# Altium footprint library UWRT_Footprint_Library_2020.PcbLib: 376 footprints (part 10 of 24)
Each footprint in its own frame and in the unit in brackets; x right, y up, seen from the top. Pads: shape width x height; smd on the part's side, far side on the other; paste and mask are expansions set on the pad; w line width, h text height; cw(c..) or ccw(c..) is an arc to the next point about the centre after c.
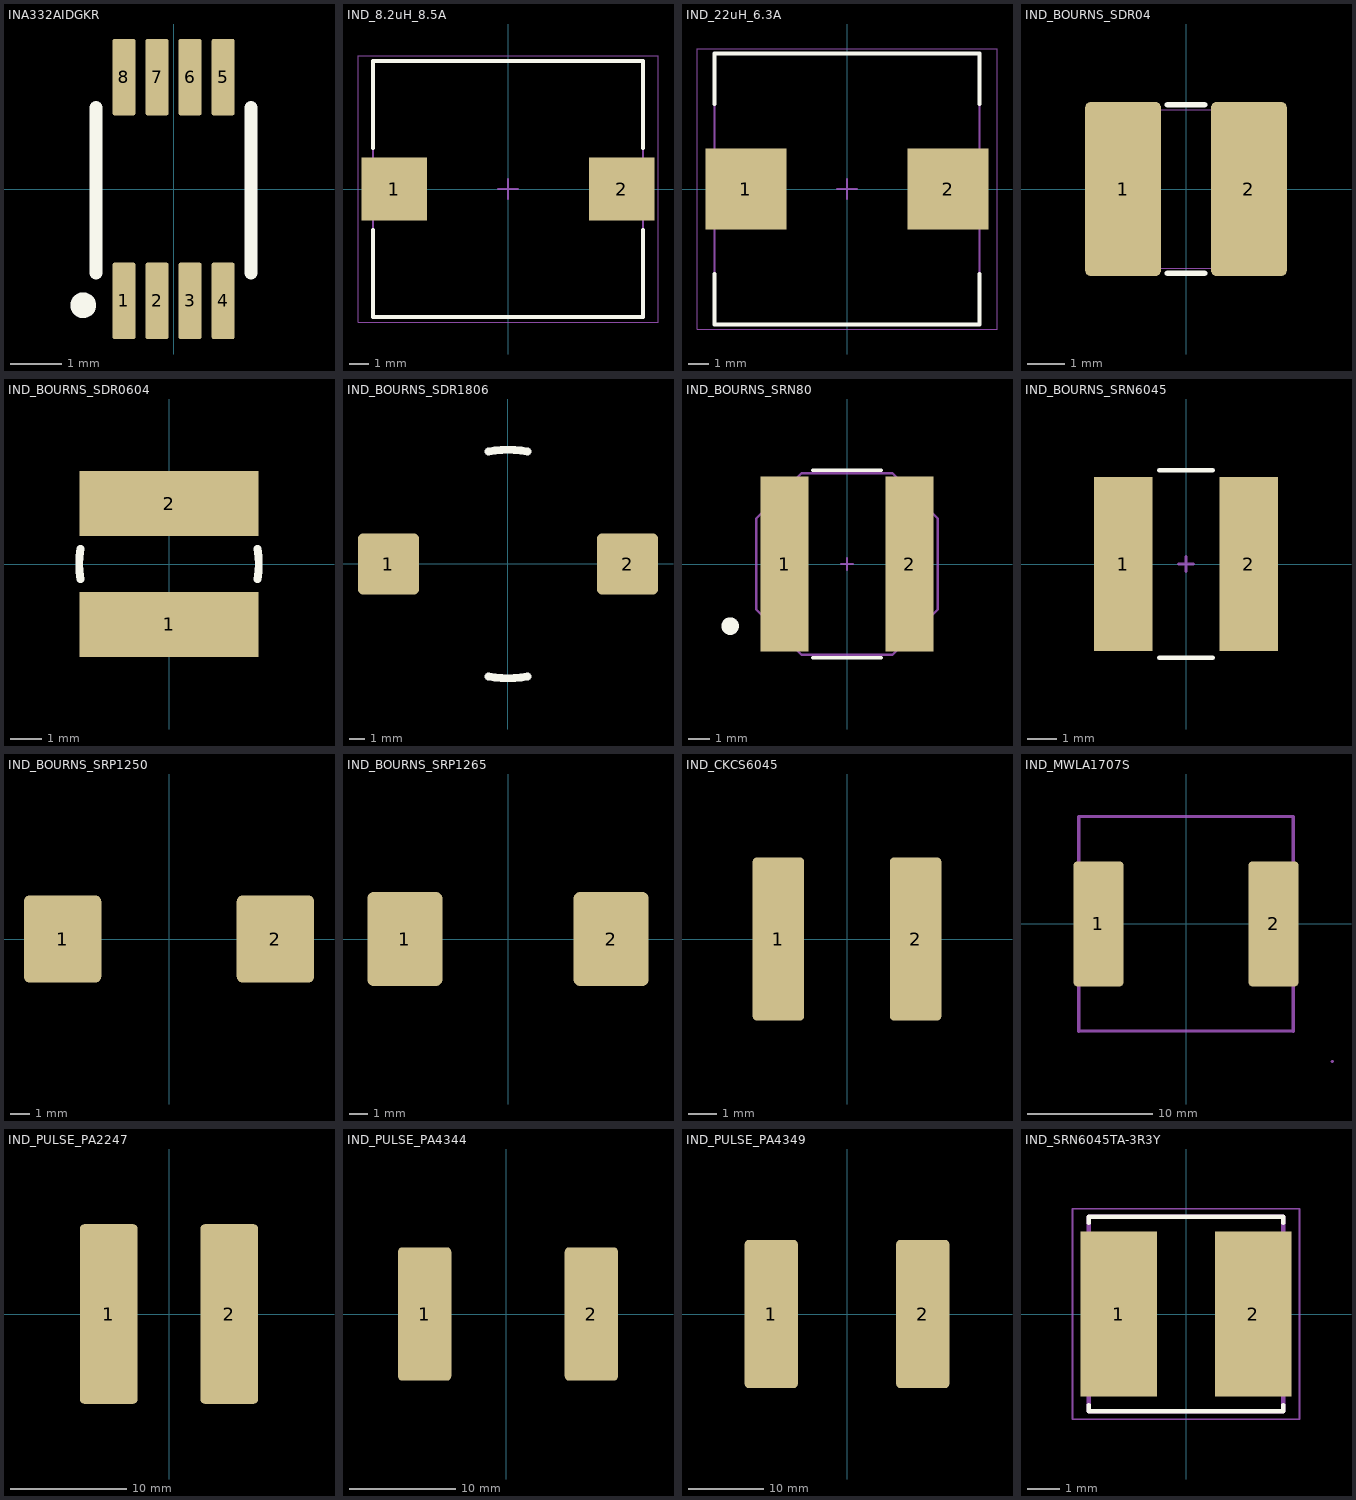
[diagram p9: the footprints below, top view; thin cyan lines are the x and y axes]

## INA332AIDGKR [mm] "Instrumentation amplifier, 8-VSSOP"
pads (8):
  rrect15% 0.45x1.5 smd mask+0.05: 1(-0.975,-2.2) 2(-0.325,-2.2) 3(0.325,-2.2) 4(0.975,-2.2) 5(0.975,2.2) 6(0.325,2.2) 7(-0.325,2.2) 8(-0.975,2.2)
Top Overlay:
  circle w0.254: c-1.778,-2.286 r0.127
  lines w0.254: -1.524,-1.651 -1.524,1.6 ; 1.524,-1.651 1.524,1.6
3D body "User Library-SOP50P310X110-8N[VSSOP_DGK_MO-187AA].STEP": height 1.15, standoff 0, extent -1.55,-2.522 1.55,2.522

## IND_8.2uH_8.5A [mm]
height 3.5
pads (2):
  rect 3.3x3.175 smd: 1(-5.715,0) 2(5.715,0)
Top Overlay:
  lines w0.2: -6.8,-2.075 -6.8,-6.45 6.8,-6.45 6.8,-2.075 ; -6.8,2.075 -6.8,6.45 6.8,6.45 6.8,2.075
Mechanical 13:
  lines w0.1: -6.79,-6.45 6.79,-6.45 6.79,6.45 -6.79,6.45 -6.79,-6.45
Mechanical 15:
  lines w0.05: -7.55,-6.7 7.55,-6.7 7.55,6.7 -7.55,6.7 -7.55,-6.7
  lines w0.1: -0.5,0 0.5,0 ; 0,-0.5 0,0.5
3D body "IND_8.2uH_8.5A.step": height 3.5, standoff 0, extent -7.01,-6.45 7.01,6.45

## IND_22uH_6.3A [mm] "Precision Wire Wound Inductor, 2-Leads, Body 13.10x13.40mm, IPC Medium Density"
height 3.7
pads (2):
  rect 4x4 smd: 1(-5,0) 2(5,0)
Top Overlay:
  lines w0.2: -6.55,-4.2 -6.55,-6.7 6.55,-6.7 6.55,-4.2 ; -6.55,4.2 -6.55,6.7 6.55,6.7 6.55,4.2
Mechanical 13:
  lines w0.1: -6.55,-6.7 -6.55,6.7 6.55,6.7 6.55,-6.7 -6.55,-6.7
Mechanical 15:
  lines w0.05: -7.425,-6.95 -7.425,6.95 7.425,6.95 7.425,-6.95 -7.425,-6.95
  lines w0.1: -0.5,0 0.5,0 ; 0,-0.5 0,0.5
3D body: height 3.7, standoff 0, extent -6.55,-6.7 6.55,6.7

## IND_BOURNS_SDR04 [mm] "SDR0403 Series - SMD Power Inductors"
height 3.5
pads (2):
  rrect15% 2.05x4.7 smd paste+0 mask+0.102: 1(-1.7,0) 2(1.7,0)
Top Overlay:
  lines w0.152: -0.5,-2.273 0.5,-2.273 ; -0.5,2.273 0.5,2.273
Mechanical 13:
  lines w0.025: -2.4,-1.073 -2.4,1.073 -1.2,2.146 1.2,2.146 2.4,1.073 2.4,-1.073 1.2,-2.146 -1.2,-2.146 -2.4,-1.073
  text "*" at -2.21,-1.27 h1.27
3D body "sdr0403.stp": height 3.2, standoff 0, extent -2.25,-2.25 2.25,2.25

## IND_BOURNS_SDR0604 [mm]
pads (2):
  rect 5.8x2.1 smd: 1(0,-1.95) 2(0,1.95)
Top Overlay:
  lines w0.254: -2.858,-0.493 cw(c0,0) -2.858,0.493 ; 2.858,-0.493 ccw(c0,0) 2.858,0.493
3D body "69538.stp": height 4.8, standoff 0, extent -2.9,-2.9 2.9,2.9

## IND_BOURNS_SDR1806 [mm]
pads (2):
  rrect15% 4x4 smd mask+0.2: 1(-7.85,0) 2(7.85,0)
Top Overlay:
  lines w0.508: -1.274,-7.391 ccw(c0,0) 1.274,-7.391 ; -1.274,7.391 cw(c0,0) 1.274,7.391
3D body "sdr1806.stp": height 6.6, standoff 0, extent -9.15,-7 9.15,7

## IND_BOURNS_SRN80 [mil]
pads (2):
  rect 87x315 smd paste+0 mask+0: 1(-112.5,0) 2(112.5,0)
Top Overlay:
  circle w15.75: c-210.3,-111.8 r7.87
  lines w6: -61.89,-168.5 61.89,-168.5 ; -61.89,168.5 61.89,168.5
Mechanical 13:
  lines w3.94: -163.5,-81.75 -163.5,81.75 -81.75,163.5 81.75,163.5 163.5,81.75 163.5,-81.75 81.75,-163.5 -81.75,-163.5 -163.5,-81.75
Mechanical 15:
  lines w3.94: -10.24,0 10.24,0 ; 0,-10.24 0,10.24
3D body: height 10, standoff 0, extent 0,0 10,10
3D body "srn8040.stp": height 156.01, standoff 0.5, extent -160.43,-155.51 160.44,155.51

## IND_BOURNS_SRN6045 [mil]
pads (2):
  rect 79x236 smd paste+0 mask+0: 1(-85,0) 2(85,0)
Top Overlay:
  lines w6: -35.98,-127 35.98,-127 ; -35.98,127 35.98,127
Mechanical 15:
  lines w3.94: -10.24,0 10.24,0 ; 0,-10.24 0,10.24
3D body: height 10, standoff 0, extent 0,0 10,10
3D body "srn6045.stp": height 177.17, standoff 0, extent -118.11,-118.1 118.11,118.12

## IND_BOURNS_SRP1250 [mm]
pads (2):
  rrect15% 4x4.5 smd: 1(-5.5,0) 2(5.5,0)
3D body "IND_BOURNS_SRP1250.step": height 5.94, standoff 0, extent -6.947,-6.744 6.947,6.744

## IND_BOURNS_SRP1265 [mm]
pads (2):
  rrect15% 4x5 smd: 1(-5.5,0) 2(5.5,0)
3D body "IND_BOURNS_SRP1250.step": height 5.94, standoff 0, extent -6.947,-6.744 6.947,6.744

## IND_CKCS6045 [mm]
pads (2):
  rrect15% 1.8x5.7 smd: 1(-2.4,0) 2(2.4,0)
3D body "User Library-SRN6045 Series.step": height 4.5, standoff 0, extent -3.15,-3 3.15,3

## IND_MWLA1707S [mm]
pads (2):
  rrect15% 4x10 smd: 1(-7,0) 2(7,0)
Mechanical 1:
  lines w0.254: -8.575,-8.6 -8.575,8.575 8.575,8.575 8.575,-8.6 ; -8.575,-8.575 8.575,-8.575 ; 11.7,-11 11.7,-11
3D body: height 7, standoff 0, extent -8.575,-8.575 8.6,8.575

## IND_PULSE_PA2247 [mm]
pads (2):
  rrect15% 5x15.5 smd: 1(-5.2,0) 2(5.2,0)
3D body "PA2247.STEP": height 9.55, standoff -0.15, extent -7.75,-8.25 7.75,8.25

## IND_PULSE_PA4344 [mm]
pads (2):
  rrect15% 5x12.5 smd: 1(-7.675,0) 2(7.975,0)
3D body "IND_PA4344_473ANLT_PUL.step": height 7.06, standoff 0, extent -9.144,-8.598 9.144,8.598

## IND_PULSE_PA4349 [mm]
pads (2):
  rrect15% 7x19.6 smd: 1(-10,0) 2(10,0)
3D body "PA4349.152ANLT.stp": height 13.1, standoff 0, extent -11.75,-11 11.75,11

## IND_SRN6045TA-3R3Y [mm]
pads (2):
  rect 2.35x5.1 smd: 1(-2.075,0) 2(2.075,0)
Top Overlay:
  lines w0.127: -3,-2.8 -3,-3 3,-3 3,-2.8 ; -3,2.8 -3,3 3,3 3,2.8
Mechanical 13:
  lines w0.127: -3,-3 -3,3 3,3 3,-3 -3,-3
Mechanical 15:
  lines w0.05: -3.5,-3.25 -3.5,3.25 3.5,3.25 3.5,-3.25 -3.5,-3.25
3D body "User Library-SRN6045TA Series.step": height 4.2, standoff 0, extent -3,-3 3,3